# Altium footprint library Miscellaneous SMD.PcbLib: 82 footprints (part 3 of 7) (continued)
## HIROSE_FX8-120S-SV [mm] "120 Contacts, Pitch 0.6mm, Surface Mount Board to Board Receptacle, FX8 Series"
height 2.5
pads (122):
  rect 0.35x1.8 smd: 1(-17.7,2.9) 2(-17.7,-2.9) 3(-17.1,2.9) 4(-17.1,-2.9) 5(-16.5,2.9) 6(-16.5,-2.9) 7(-15.9,2.9) 8(-15.9,-2.9) 9(-15.3,2.9) 10(-15.3,-2.9) 11(-14.7,2.9) 12(-14.7,-2.9) 13(-14.1,2.9) 14(-14.1,-2.9) 15(-13.5,2.9) 16(-13.5,-2.9) 17(-12.9,2.9) 18(-12.9,-2.9) 19(-12.3,2.9) 20(-12.3,-2.9) 21(-11.7,2.9) 22(-11.7,-2.9) 23(-11.1,2.9) 24(-11.1,-2.9) 25(-10.5,2.9) 26(-10.5,-2.9) 27(-9.9,2.9) 28(-9.9,-2.9) 29(-9.3,2.9) 30(-9.3,-2.9) 31(-8.7,2.9) 32(-8.7,-2.9) 33(-8.1,2.9) 34(-8.1,-2.9) 35(-7.5,2.9) 36(-7.5,-2.9) 37(-6.9,2.9) 38(-6.9,-2.9) 39(-6.3,2.9) 40(-6.3,-2.9) 41(-5.7,2.9) 42(-5.7,-2.9) 43(-5.1,2.9) 44(-5.1,-2.9) 45(-4.5,2.9) 46(-4.5,-2.9) 47(-3.9,2.9) 48(-3.9,-2.9) 49(-3.3,2.9) 50(-3.3,-2.9) 51(-2.7,2.9) 52(-2.7,-2.9) 53(-2.1,2.9) 54(-2.1,-2.9) 55(-1.5,2.9) 56(-1.5,-2.9) 57(-0.9,2.9) 58(-0.9,-2.9) 59(-0.3,2.9) 60(-0.3,-2.9) 61(0.3,2.9) 62(0.3,-2.9) 63(0.9,2.9) 64(0.9,-2.9) 65(1.5,2.9) 66(1.5,-2.9) 67(2.1,2.9) 68(2.1,-2.9) 69(2.7,2.9) 70(2.7,-2.9) 71(3.3,2.9) 72(3.3,-2.9) 73(3.9,2.9) 74(3.9,-2.9) 75(4.5,2.9) 76(4.5,-2.9) 77(5.1,2.9) 78(5.1,-2.9) 79(5.7,2.9) 80(5.7,-2.9) 81(6.3,2.9) 82(6.3,-2.9) 83(6.9,2.9) 84(6.9,-2.9) 85(7.5,2.9) 86(7.5,-2.9) 87(8.1,2.9) 88(8.1,-2.9) 89(8.7,2.9) 90(8.7,-2.9) 91(9.3,2.9) 92(9.3,-2.9) 93(9.9,2.9) 94(9.9,-2.9) 95(10.5,2.9) 96(10.5,-2.9) 97(11.1,2.9) 98(11.1,-2.9) 99(11.7,2.9) 100(11.7,-2.9) 101(12.3,2.9) 102(12.3,-2.9) 103(12.9,2.9) 104(12.9,-2.9) 105(13.5,2.9) 106(13.5,-2.9) 107(14.1,2.9) 108(14.1,-2.9) 109(14.7,2.9) 110(14.7,-2.9) 111(15.3,2.9) 112(15.3,-2.9) 113(15.9,2.9) 114(15.9,-2.9) 115(16.5,2.9) 116(16.5,-2.9) 117(17.1,2.9) 118(17.1,-2.9) 119(17.7,2.9) 120(17.7,-2.9)
  round 0.5 hole 1.1 unplated mask+0.3: P1(-20.1,1.8)
  round 0.5 hole 0.7 unplated mask+0.1: P1(20.1,1.8)
Top Overlay:
  circle w0.25: c-18.475,3.55 r0.125
  lines w0.2: -20.836,1.375 -21.125,1.375 ; -20.735,2.365 -21.3,1.8 -21.3,-2.8 -18.175,-2.8 ; -20.665,2.435 -20.3,2.8 -18.175,2.8 ; -19.474,2.375 -18.175,2.375 ; -19.4,-2.125 -19.6,-2.325 ; -19.4,-1.725 -19.4,-2.175 ; -19.4,0.775 -19.4,1.318 ; -19.337,2.175 -18.175,2.175 ; -18.9,-1.725 -18.9,0.775 ; -18.65,-1.475 18.65,-1.475 ; -18.65,0.776 -20.525,0.775 ; -18.175,-2.375 -19.6,-2.375 ; -18.175,-2.175 -19.4,-2.175 ; 18.175,-2.8 21.3,-2.8 21.3,2.8 18.175,2.8 ; 18.175,-2.375 19.6,-2.375 ; 18.175,-2.175 19.4,-2.175 ; 18.175,2.175 19.4,2.175 ; 18.175,2.375 19.6,2.375 ; 18.65,0.775 20.525,0.775 ; 18.9,-1.725 18.9,0.775 ; 19.4,-2.125 19.6,-2.325 ; 19.4,-1.725 19.4,-2.175 ; 19.4,0.775 19.4,2.175 ; 19.4,1.175 19.6,1.375 ; 19.6,2.215 19.6,2.375 ; 20.592,1.375 21.125,1.375 ; -21.125,-2.325 -20.525,-1.725 ; -21.125,-2.325 -19.6,-2.325 ; -21.125,-2.325 -21.125,1.375 ; -21.125,1.375 -20.525,0.775 ; -20.525,-1.725 -18.65,-1.725 -18.65,1.475 18.65,1.475 18.65,-1.725 20.525,-1.725 ; -20.525,-1.725 -20.525,0.775 ; -19.6,-2.375 -19.4,-2.175 ; -19.6,-2.375 -19.6,-2.325 ; 19.4,-2.175 19.6,-2.375 ; 19.4,2.175 19.6,2.375 ; 19.6,-2.375 19.6,-2.325 ; 19.6,-2.325 21.125,-2.325 ; 20.525,-1.725 20.525,0.775 ; 20.525,-1.725 21.125,-2.325 ; 20.525,0.775 21.125,1.375 ; 21.125,-2.325 21.125,1.375
Mechanical 8:
  drawing of 734 lines, arcs and shapes, not listed
Mechanical 14:
  drawing of 408 lines, arcs and shapes, not listed
Mechanical 15:
  lines w0.05: -21.55,-4.05 -21.55,4.05 21.55,4.05 21.55,-4.05 -21.55,-4.05
3D body "HIROSE_FX8-120S-SV.stp": height 2.25, standoff -0.75, extent -21.3,-3.5 21.3,3.5

## HIROSE_FX8C-60P-SV2 [mm] "60 Contacts, Pitch 0.6mm, Surface Mount Board to Board Header, FX8C Series"
height 7.1
pads (62):
  rect 0.35x2.45 smd: 1(-8.7,-2.225) 2(-8.7,2.225) 3(-8.1,-2.225) 4(-8.1,2.225) 5(-7.5,-2.225) 6(-7.5,2.225) 7(-6.9,-2.225) 8(-6.9,2.225) 9(-6.3,-2.225) 10(-6.3,2.225) 11(-5.7,-2.225) 12(-5.7,2.225) 13(-5.1,-2.225) 14(-5.1,2.225) 15(-4.5,-2.225) 16(-4.5,2.225) 17(-3.9,-2.225) 18(-3.9,2.225) 19(-3.3,-2.225) 20(-3.3,2.225) 21(-2.7,-2.225) 22(-2.7,2.225) 23(-2.1,-2.225) 24(-2.1,2.225) 25(-1.5,-2.225) 26(-1.5,2.225) 27(-0.9,-2.225) 28(-0.9,2.225) 29(-0.3,-2.225) 30(-0.3,2.225) 31(0.3,-2.225) 32(0.3,2.225) 33(0.9,-2.225) 34(0.9,2.225) 35(1.5,-2.225) 36(1.5,2.225) 37(2.1,-2.225) 38(2.1,2.225) 39(2.7,-2.225) 40(2.7,2.225) 41(3.3,-2.225) 42(3.3,2.225) 43(3.9,-2.225) 44(3.9,2.225) 45(4.5,-2.225) 46(4.5,2.225) 47(5.1,-2.225) 48(5.1,2.225) 49(5.7,-2.225) 50(5.7,2.225) 51(6.3,-2.225) 52(6.3,2.225) 53(6.9,-2.225) 54(6.9,2.225) 55(7.5,-2.225) 56(7.5,2.225) 57(8.1,-2.225) 58(8.1,2.225) 59(8.7,-2.225) 60(8.7,2.225)
  round 0.5 hole 1.1 unplated mask+0.3: P1(-11.1,-1.5)
  round 0.5 hole 0.7 unplated mask+0.1: P1(11.1,-1.5)
Top Overlay:
  circle w0.25: c-9.475,-3.2 r0.125
  lines w0.2: -11.625,-1 -11.75,-1 -11.75,1.95 -10.35,1.95 ; -10.575,-1 -10.35,-1 ; -10.35,-0.75 -10.35,-2.15 -9.225,-2.15 ; -10.35,1.7 -10.35,2.15 -9.225,2.15 ; -10.35,-0.75 -10.35,1.7 ; -9.699,0.75 -9.225,0.75 ; -9.699,1.551 -9.2,1.551 ; -9.225,-2.55 -11.3,-2.55 -12.3,-1.55 -12.3,2.55 -9.225,2.55 ; -9.225,-1.55 -9.699,-1.55 -9.699,1.7 -11.326,1.7 ccw(c-11.318,1.518) -11.5,1.526 -11.5,-0.576 ccw(c-11.321,-0.571) -11.314,-0.75 -9.225,-0.75 ; 9.225,-2.55 12.3,-2.55 12.3,2.55 9.225,2.55 ; 9.225,-2.15 10.35,-2.15 10.35,-0.75 10.35,1.7 ; 9.225,-1.549 9.7,-1.549 ; 9.225,-0.75 9.7,-0.75 11.314,-0.751 ccw(c11.317,-0.568) 11.5,-0.576 11.5,1.526 ccw(c11.32,1.52) 11.326,1.7 9.699,1.7 9.7,-1.55 ; 9.225,0.75 9.699,0.75 ; 9.225,1.55 9.699,1.55 ; 9.225,2.15 10.35,2.15 10.35,1.7 ; 10.35,-1 10.94,-1 ; 10.35,1.95 11.75,1.95 11.75,-1 11.26,-1
Mechanical 8:
  lines w0.05: -11.6,-1.5 -11.1,-1.5 ; -11.1,-2 -11.1,-1.5 ; -11.1,-1 -11.1,-1.5 ; -10.6,-1.5 -11.1,-1.5 ; -9.2,-2.225 -8.7,-2.225 ; -9.2,2.225 -8.7,2.225 ; -8.7,-2.725 -8.7,-2.225 ; -8.7,-1.725 -8.7,-2.225 ; -8.7,1.725 -8.7,2.225 ; -8.7,2.725 -8.7,2.225 ; -8.1,-2.725 -8.1,-2.225 ; -8.1,-1.725 -8.1,-2.225 ; -8.1,1.725 -8.1,2.225 ; -8.1,2.725 -8.1,2.225 ; -7.5,-2.225 -8.1,-2.225 ; -7.5,2.225 -8.1,2.225 ; -0.5,0 0,0 ; 0,-0.5 0,0 ; 0,0.5 0,0 ; 0.5,0 0,0 ; 7.5,-2.225 8.1,-2.225 ; 7.5,2.225 8.1,2.225 ; 8.1,-2.725 8.1,-2.225 ; 8.1,-1.725 8.1,-2.225 ; 8.1,1.725 8.1,2.225 ; 8.1,2.725 8.1,2.225 ; 8.7,-2.725 8.7,-2.225 ; 8.7,-1.725 8.7,-2.225 ; 8.7,1.725 8.7,2.225 ; 8.7,2.725 8.7,2.225 ; 9.2,-2.225 8.7,-2.225 ; 9.2,2.225 8.7,2.225 ; 10.6,-1.5 11.1,-1.5 ; 11.1,-2 11.1,-1.5 ; 11.1,-1 11.1,-1.5 ; 11.6,-1.5 11.1,-1.5 ; -8.7,-2.225 -8.1,-2.225 ; -8.7,2.225 -8.1,2.225 ; 8.1,-2.225 8.7,-2.225 ; 8.1,2.225 8.7,2.225 ; -8.875,-3.45 -8.875,-1 -8.525,-1 -8.525,-3.45 -8.875,-3.45 ; -8.875,1 -8.875,3.45 -8.525,3.45 -8.525,1 -8.875,1 ; -8.275,-3.45 -8.275,-1 -7.925,-1 -7.925,-3.45 -8.275,-3.45 ; -8.275,1 -8.275,3.45 -7.925,3.45 -7.925,1 -8.275,1 ; 7.925,-3.45 7.925,-1 8.275,-1 8.275,-3.45 7.925,-3.45 ; 7.925,1 7.925,3.45 8.275,3.45 8.275,1 7.925,1 ; 8.525,-3.45 8.525,-1 8.875,-1 8.875,-3.45 8.525,-3.45 ; 8.525,1 8.525,3.45 8.875,3.45 8.875,1 8.525,1
Mechanical 14:
  circle w0.25: c-9.475,-3.2 r0.125
  lines w0.1: -10.35,-1 -11.75,-1 -11.75,1.95 -10.35,1.95 ; -10.35,-0.75 -10.35,-2.15 10.35,-2.15 10.35,-0.75 10.35,1.7 ; -10.35,1.7 -10.35,2.15 10.35,2.15 10.35,1.7 ; -10.35,-0.75 -10.35,1.7 ; -9.699,0.75 -9,0.75 -9,-0.75 -11.314,-0.75 cw(c-11.321,-0.571) -11.5,-0.576 -11.5,1.526 cw(c-11.318,1.518) -11.326,1.7 -9.699,1.7 -9.699,-1.55 9.7,-1.55 9.699,1.7 11.326,1.7 cw(c11.32,1.52) 11.5,1.526 11.5,-0.576 cw(c11.317,-0.568) 11.314,-0.751 9.7,-0.75 9,-0.75 9,0.75 9.699,0.75 ; -9.699,1.55 9.699,1.55 ; -8.825,-2.55 -8.825,-3.25 -8.575,-3.25 -8.575,-2.55 ; -8.825,2.55 -8.825,3.25 -8.575,3.25 -8.575,2.55 ; -8.225,-2.55 -8.225,-3.25 -7.975,-3.25 -7.975,-2.55 ; -8.225,2.55 -8.225,3.25 -7.975,3.25 -7.975,2.55 ; 7.975,-2.55 7.975,-3.25 8.225,-3.25 8.225,-2.55 ; 7.975,2.55 7.975,3.25 8.225,3.25 8.225,2.55 ; 8.575,-2.55 8.575,-3.25 8.825,-3.25 8.825,-2.55 ; 8.575,2.55 8.575,3.25 8.825,3.25 8.825,2.55 ; 10.35,-1 11.75,-1 11.75,1.95 10.35,1.95 ; -12.3,-1.55 -12.3,2.55 12.3,2.55 12.3,-2.55 -11.3,-2.55 -12.3,-1.55
Mechanical 15:
  lines w0.05: -12.55,-3.7 -12.55,3.7 12.55,3.7 12.55,-3.7 -12.55,-3.7
3D body "HIROSE_FX8C-60P-SV2.stp": height 6.8, standoff -0.85, extent -12.3,-3.25 12.3,3.25

## HIROSE_FX8C-60S-SV [mm] "60 Contacts, Pitch 0.6mm, Surface Mount Board to Board Receptacle, FX8C Series"
height 4.2
pads (62):
  rect 0.35x1.7 smd: 1(-8.7,2.85) 2(-8.7,-2.85) 3(-8.1,2.85) 4(-8.1,-2.85) 5(-7.5,2.85) 6(-7.5,-2.85) 7(-6.9,2.85) 8(-6.9,-2.85) 9(-6.3,2.85) 10(-6.3,-2.85) 11(-5.7,2.85) 12(-5.7,-2.85) 13(-5.1,2.85) 14(-5.1,-2.85) 15(-4.5,2.85) 16(-4.5,-2.85) 17(-3.9,2.85) 18(-3.9,-2.85) 19(-3.3,2.85) 20(-3.3,-2.85) 21(-2.7,2.85) 22(-2.7,-2.85) 23(-2.1,2.85) 24(-2.1,-2.85) 25(-1.5,2.85) 26(-1.5,-2.85) 27(-0.9,2.85) 28(-0.9,-2.85) 29(-0.3,2.85) 30(-0.3,-2.85) 31(0.3,2.85) 32(0.3,-2.85) 33(0.9,2.85) 34(0.9,-2.85) 35(1.5,2.85) 36(1.5,-2.85) 37(2.1,2.85) 38(2.1,-2.85) 39(2.7,2.85) 40(2.7,-2.85) 41(3.3,2.85) 42(3.3,-2.85) 43(3.9,2.85) 44(3.9,-2.85) 45(4.5,2.85) 46(4.5,-2.85) 47(5.1,2.85) 48(5.1,-2.85) 49(5.7,2.85) 50(5.7,-2.85) 51(6.3,2.85) 52(6.3,-2.85) 53(6.9,2.85) 54(6.9,-2.85) 55(7.5,2.85) 56(7.5,-2.85) 57(8.1,2.85) 58(8.1,-2.85) 59(8.7,2.85) 60(8.7,-2.85)
  round 0.5 hole 1.1 unplated mask+0.3: P1(-11.1,1.8)
  round 0.5 hole 0.7 unplated mask+0.1: P1(11.1,1.8)
Top Overlay:
  circle w0.25: c-9.475,3.55 r0.125
  lines w0.2: -11.836,1.375 -12.125,1.375 ; -11.735,2.365 -12.3,1.8 -12.3,-2.8 -9.175,-2.8 ; -11.665,2.435 -11.3,2.8 -9.175,2.8 ; -10.474,2.375 -9.175,2.375 ; -10.4,-2.125 -10.6,-2.325 ; -10.4,-1.725 -10.4,-2.175 ; -10.4,0.775 -10.4,1.318 ; -10.337,2.175 -9.175,2.175 ; -9.9,-1.725 -9.9,0.775 ; -9.65,-1.475 9.65,-1.475 ; -9.65,0.776 -11.525,0.775 ; -9.175,-2.375 -10.6,-2.375 ; -9.175,-2.175 -10.4,-2.175 ; 9.175,-2.8 12.3,-2.8 12.3,2.8 9.175,2.8 ; 9.175,-2.375 10.6,-2.375 ; 9.175,-2.175 10.4,-2.175 ; 9.175,2.175 10.4,2.175 ; 9.175,2.375 10.6,2.375 ; 9.65,0.775 11.525,0.775 ; 9.9,-1.725 9.9,0.775 ; 10.4,-2.125 10.6,-2.325 ; 10.4,-1.725 10.4,-2.175 ; 10.4,0.775 10.4,2.175 ; 10.4,1.175 10.6,1.375 ; 10.6,2.215 10.6,2.375 ; 11.592,1.375 12.125,1.375 ; -12.125,-2.325 -11.525,-1.725 ; -12.125,-2.325 -10.6,-2.325 ; -12.125,-2.325 -12.125,1.375 ; -12.125,1.375 -11.525,0.775 ; -11.525,-1.725 -9.65,-1.725 -9.65,1.475 9.65,1.475 9.65,-1.725 11.525,-1.725 ; -11.525,-1.725 -11.525,0.775 ; -10.6,-2.375 -10.4,-2.175 ; -10.6,-2.375 -10.6,-2.325 ; 10.4,-2.175 10.6,-2.375 ; 10.4,2.175 10.6,2.375 ; 10.6,-2.375 10.6,-2.325 ; 10.6,-2.325 12.125,-2.325 ; 11.525,-1.725 11.525,0.775 ; 11.525,-1.725 12.125,-2.325 ; 11.525,0.775 12.125,1.375 ; 12.125,-2.325 12.125,1.375
Mechanical 8:
  circle w0.05: c-11.1,1.8 r0.55
  lines w0.05: -11.6,1.8 -11.1,1.8 ; -11.1,1.3 -11.1,1.8 ; -11.1,2.3 -11.1,1.8 ; -10.6,1.8 -11.1,1.8 ; -9.2,-2.85 -8.7,-2.85 ; -9.2,2.85 -8.7,2.85 ; -8.7,-3.35 -8.7,-2.85 ; -8.7,-2.35 -8.7,-2.85 ; -8.7,2.35 -8.7,2.85 ; -8.7,3.35 -8.7,2.85 ; -8.1,-3.35 -8.1,-2.85 ; -8.1,-2.35 -8.1,-2.85 ; -8.1,2.35 -8.1,2.85 ; -8.1,3.35 -8.1,2.85 ; -7.5,-2.85 -8.1,-2.85 ; -7.5,2.85 -8.1,2.85 ; -0.5,0 0,0 ; 0,-0.5 0,0 ; 0,0.5 0,0 ; 0.5,0 0,0 ; 7.5,-2.85 8.1,-2.85 ; 7.5,2.85 8.1,2.85 ; 8.1,-3.35 8.1,-2.85 ; 8.1,-2.35 8.1,-2.85 ; 8.1,2.35 8.1,2.85 ; 8.1,3.35 8.1,2.85 ; 8.7,-3.35 8.7,-2.85 ; 8.7,-2.35 8.7,-2.85 ; 8.7,2.35 8.7,2.85 ; 8.7,3.35 8.7,2.85 ; 9.2,-2.85 8.7,-2.85 ; 9.2,2.85 8.7,2.85 ; 10.6,1.8 11.1,1.8 ; 11.1,1.3 11.1,1.8 ; 11.1,2.3 11.1,1.8 ; 11.6,1.8 11.1,1.8 ; -8.7,-2.85 -8.1,-2.85 ; -8.7,2.85 -8.1,2.85 ; 8.1,-2.85 8.7,-2.85 ; 8.1,2.85 8.7,2.85 ; -8.875,-3.7 -8.875,-2 -8.525,-2 -8.525,-3.7 -8.875,-3.7 ; -8.875,2 -8.875,3.7 -8.525,3.7 -8.525,2 -8.875,2 ; -8.275,-3.7 -8.275,-2 -7.925,-2 -7.925,-3.7 -8.275,-3.7 ; -8.275,2 -8.275,3.7 -7.925,3.7 -7.925,2 -8.275,2 ; 7.925,-3.7 7.925,-2 8.275,-2 8.275,-3.7 7.925,-3.7 ; 7.925,2 7.925,3.7 8.275,3.7 8.275,2 7.925,2 ; 8.525,-3.7 8.525,-2 8.875,-2 8.875,-3.7 8.525,-3.7 ; 8.525,2 8.525,3.7 8.875,3.7 8.875,2 8.525,2
Mechanical 14:
  circle w0.25: c-9.475,3.55 r0.125
  lines w0.1: -10.4,-2.125 -10.6,-2.325 ; -10.4,-1.725 -10.4,-2.175 ; -10.4,0.775 -10.4,2.175 ; -10.4,1.175 -10.6,1.375 ; -9.9,-1.725 -9.9,0.775 ; -9.65,0.775 -11.525,0.775 ; -8.825,-2.8 -8.825,-3.5 -8.575,-3.5 -8.575,-2.8 ; -8.825,2.8 -8.825,3.5 -8.575,3.5 -8.575,2.8 ; -8.225,-2.8 -8.225,-3.5 -7.975,-3.5 -7.975,-2.8 ; -8.225,2.8 -8.225,3.5 -7.975,3.5 -7.975,2.8 ; 7.975,-2.8 7.975,-3.5 8.225,-3.5 8.225,-2.8 ; 7.975,2.8 7.975,3.5 8.225,3.5 8.225,2.8 ; 8.575,-2.8 8.575,-3.5 8.825,-3.5 8.825,-2.8 ; 8.575,2.8 8.575,3.5 8.825,3.5 8.825,2.8 ; 9.65,0.775 11.525,0.775 ; 9.9,-1.725 9.9,0.775 ; 10.4,-2.125 10.6,-2.325 ; 10.4,-1.725 10.4,-2.175 ; 10.4,0.775 10.4,2.175 ; 10.4,1.175 10.6,1.375 ; -12.125,-2.325 -11.525,-1.725 ; -12.125,-2.325 -12.125,1.375 ; -12.125,-2.325 -10.6,-2.325 ; -12.125,1.375 -11.525,0.775 ; -12.125,1.375 -10.6,1.375 ; -11.525,-1.725 -11.525,0.775 ; -11.525,-1.725 -9.65,-1.725 -9.65,1.475 ; -10.6,-2.375 -10.4,-2.175 ; -10.6,-2.375 10.6,-2.375 ; -10.6,-2.375 -10.6,-2.325 ; -10.6,1.375 -10.6,2.375 ; -10.6,2.375 10.6,2.375 ; -10.6,2.375 -10.4,2.175 ; -10.4,-2.175 10.4,-2.175 ; -10.4,2.175 10.4,2.175 ; -9.65,1.475 9.65,1.475 ; -9.65,1.475 -9.55,1.375 ; -9.55,-1.375 -9.55,1.375 ; -9.55,-1.375 9.55,-1.375 ; -9.55,-1.375 -9.65,-1.475 9.65,-1.475 9.55,-1.375 ; -9.55,1.375 9.55,1.375 ; 9.55,-1.375 9.55,1.375 ; 9.55,1.375 9.65,1.475 ; 9.65,1.475 9.65,-1.725 11.525,-1.725 ; 10.4,-2.175 10.6,-2.375 ; 10.4,2.175 10.6,2.375 ; 10.6,-2.375 10.6,-2.325 ; 10.6,-2.325 12.125,-2.325 ; 10.6,1.375 10.6,2.375 ; 10.6,1.375 12.125,1.375 ; 11.525,-1.725 12.125,-2.325 ; 11.525,-1.725 11.525,0.775 ; 11.525,0.775 12.125,1.375 ; 12.125,-2.325 12.125,1.375 ; -12.3,-2.8 12.3,-2.8 12.3,2.8 -11.3,2.8 -12.3,1.8 -12.3,-2.8
Mechanical 15:
  lines w0.05: -12.55,-3.95 -12.55,3.95 12.55,3.95 12.55,-3.95 -12.55,-3.95
3D body "HIROSE_FX8C-60S-SV.stp": height 3.95, standoff -0.8, extent -12.3,-3.5 12.3,3.5

## HIROSE_FX8C-120P-SV [mm] "120 Contacts, Pitch 0.6mm, Surface Mount Board to Board Header, FX8C Series"
height 4.7
pads (122):
  rect 0.35x2.45 smd: 1(-17.7,-2.225) 2(-17.7,2.225) 3(-17.1,-2.225) 4(-17.1,2.225) 5(-16.5,-2.225) 6(-16.5,2.225) 7(-15.9,-2.225) 8(-15.9,2.225) 9(-15.3,-2.225) 10(-15.3,2.225) 11(-14.7,-2.225) 12(-14.7,2.225) 13(-14.1,-2.225) 14(-14.1,2.225) 15(-13.5,-2.225) 16(-13.5,2.225) 17(-12.9,-2.225) 18(-12.9,2.225) 19(-12.3,-2.225) 20(-12.3,2.225) 21(-11.7,-2.225) 22(-11.7,2.225) 23(-11.1,-2.225) 24(-11.1,2.225) 25(-10.5,-2.225) 26(-10.5,2.225) 27(-9.9,-2.225) 28(-9.9,2.225) 29(-9.3,-2.225) 30(-9.3,2.225) 31(-8.7,-2.225) 32(-8.7,2.225) 33(-8.1,-2.225) 34(-8.1,2.225) 35(-7.5,-2.225) 36(-7.5,2.225) 37(-6.9,-2.225) 38(-6.9,2.225) 39(-6.3,-2.225) 40(-6.3,2.225) 41(-5.7,-2.225) 42(-5.7,2.225) 43(-5.1,-2.225) 44(-5.1,2.225) 45(-4.5,-2.225) 46(-4.5,2.225) 47(-3.9,-2.225) 48(-3.9,2.225) 49(-3.3,-2.225) 50(-3.3,2.225) 51(-2.7,-2.225) 52(-2.7,2.225) 53(-2.1,-2.225) 54(-2.1,2.225) 55(-1.5,-2.225) 56(-1.5,2.225) 57(-0.9,-2.225) 58(-0.9,2.225) 59(-0.3,-2.225) 60(-0.3,2.225) 61(0.3,-2.225) 62(0.3,2.225) 63(0.9,-2.225) 64(0.9,2.225) 65(1.5,-2.225) 66(1.5,2.225) 67(2.1,-2.225) 68(2.1,2.225) 69(2.7,-2.225) 70(2.7,2.225) 71(3.3,-2.225) 72(3.3,2.225) 73(3.9,-2.225) 74(3.9,2.225) 75(4.5,-2.225) 76(4.5,2.225) 77(5.1,-2.225) 78(5.1,2.225) 79(5.7,-2.225) 80(5.7,2.225) 81(6.3,-2.225) 82(6.3,2.225) 83(6.9,-2.225) 84(6.9,2.225) 85(7.5,-2.225) 86(7.5,2.225) 87(8.1,-2.225) 88(8.1,2.225) 89(8.7,-2.225) 90(8.7,2.225) 91(9.3,-2.225) 92(9.3,2.225) 93(9.9,-2.225) 94(9.9,2.225) 95(10.5,-2.225) 96(10.5,2.225) 97(11.1,-2.225) 98(11.1,2.225) 99(11.7,-2.225) 100(11.7,2.225) 101(12.3,-2.225) 102(12.3,2.225) 103(12.9,-2.225) 104(12.9,2.225) 105(13.5,-2.225) 106(13.5,2.225) 107(14.1,-2.225) 108(14.1,2.225) 109(14.7,-2.225) 110(14.7,2.225) 111(15.3,-2.225) 112(15.3,2.225) 113(15.9,-2.225) 114(15.9,2.225) 115(16.5,-2.225) 116(16.5,2.225) 117(17.1,-2.225) 118(17.1,2.225) 119(17.7,-2.225) 120(17.7,2.225)
  round 0.5 hole 1.1 unplated mask+0.3: P1(-20.1,-1.5)
  round 0.5 hole 0.7 unplated mask+0.1: P1(20.1,-1.5)
Top Overlay:
  circle w0.25: c-18.475,-3.2 r0.125
  lines w0.2: -20.329,-1 -20.75,-1 -20.75,1.95 -19.35,1.95 ; -19.871,-1 -19.35,-1 ; -19.35,-0.75 -19.35,-2.15 -18.225,-2.15 ; -19.35,1.7 -19.35,2.15 -18.225,2.15 ; -19.339,-0.75 -19.339,1.7 ; -18.699,1.55 -18.225,1.55 ; -18.699,1.7 -18.699,-0.75 ; -18.225,-2.55 -20.3,-2.55 -21.3,-1.55 -21.3,2.55 -18.225,2.55 ; -18.225,-1.7 -18.7,-1.7 ; -18.225,-1.55 -18.7,-1.55 -18.7,-1.7 ; -18.225,1.7 -20.326,1.7 ccw(c-20.336,1.536) -20.5,1.526 -20.5,-0.576 ccw(c-20.333,-0.583) -20.326,-0.75 -18.699,-0.75 ; 18.225,-2.55 21.3,-2.55 21.3,2.55 18.225,2.55 ; 18.225,-2.15 19.35,-2.15 19.35,2.15 18.225,2.15 ; 18.225,-1.7 18.7,-1.7 18.7,-0.75 ; 18.225,-1.55 18.7,-1.55 ; 18.225,1.55 18.699,1.55 ; 18.225,1.7 20.326,1.7 cw(c20.333,1.532) 20.5,1.526 20.5,-0.576 cw(c20.334,-0.584) 20.326,-0.75 18.699,-0.75 ; 18.699,1.7 18.7,-0.75 ; 19.35,-1 20.75,-1 20.75,1.95 19.35,1.95 ; -18.7,-1.7 -18.7,-0.75 ; 18.7,-1.55 18.7,-1.55
Mechanical 8:
  drawing of 856 lines, arcs and shapes, not listed
Mechanical 14:
  circle w0.25: c-18.475,-3.2 r0.125
  lines w0.1: -19.35,-1 -20.75,-1 -20.75,1.95 -19.35,1.95 ; -19.35,-0.75 -19.35,-2.15 19.35,-2.15 19.35,2.15 -19.35,2.15 -19.35,1.7 ; -19.339,-0.75 -19.339,1.7 ; -18.699,1.55 18.699,1.55 ; -18.699,1.7 -18.699,-0.75 ; -17.825,-2.55 -17.825,-3.25 -17.575,-3.25 -17.575,-2.55 ; -17.825,-1.55 -17.825,-1.45 -17.575,-1.45 -17.575,-1.55 ; -17.825,1.55 -17.825,1.45 -17.575,1.45 -17.575,1.55 ; -17.825,2.55 -17.825,3.25 -17.575,3.25 -17.575,2.55 ; -17.225,-2.55 -17.225,-3.25 -16.975,-3.25 -16.975,-2.55 ; -17.225,-1.55 -17.225,-1.45 -16.975,-1.45 -16.975,-1.55 ; -17.225,1.55 -17.225,1.45 -16.975,1.45 -16.975,1.55 ; -17.225,2.55 -17.225,3.25 -16.975,3.25 -16.975,2.55 ; 16.975,-2.55 16.975,-3.25 17.225,-3.25 17.225,-2.55 ; 16.975,-1.55 16.975,-1.45 17.225,-1.45 17.225,-1.55 ; 16.975,1.55 16.975,1.45 17.225,1.45 17.225,1.55 ; 16.975,2.55 16.975,3.25 17.225,3.25 17.225,2.55 ; 17.575,-2.55 17.575,-3.25 17.825,-3.25 17.825,-2.55 ; 17.575,-1.55 17.575,-1.45 17.825,-1.45 17.825,-1.55 ; 17.575,1.55 17.575,1.45 17.825,1.45 17.825,1.55 ; 17.575,2.55 17.575,3.25 17.825,3.25 17.825,2.55 ; 18.699,1.7 18.7,-0.75 ; 19.35,-1 20.75,-1 20.75,1.95 19.35,1.95 ; -18.7,-1.7 -18.7,-1.55 18.7,-1.55 ; -18.7,-1.7 18.7,-1.7 18.7,-0.75 ; -18.7,-1.7 -18.7,-0.75 ; -18.699,-0.75 -20.326,-0.75 cw(c-20.333,-0.583) -20.5,-0.576 -20.5,1.526 cw(c-20.336,1.536) -20.326,1.7 20.326,1.7 cw(c20.333,1.532) 20.5,1.526 20.5,-0.576 cw(c20.334,-0.584) 20.326,-0.75 18.699,-0.75 ; 18.7,-1.55 18.7,-1.55 ; -21.3,-1.55 -21.3,2.55 21.3,2.55 21.3,-2.55 -20.3,-2.55 -21.3,-1.55
Mechanical 15:
  lines w0.05: -21.55,-3.7 -21.55,3.7 21.55,3.7 21.55,-3.7 -21.55,-3.7
3D body "HIROSE_FX8C-120P-SV.stp": height 4.8, standoff -0.85, extent -21.3,-3.25 21.3,3.25

## HIROSE_FX8C-120S-SV5 [mm] "120 Contacts, Pitch 0.6mm, Surface Mount Board to Board Receptacle, FX8C Series"
height 9.2
pads (122):
  rect 0.35x1.7 smd: 1(-17.7,2.85) 2(-17.7,-2.85) 3(-17.1,2.85) 4(-17.1,-2.85) 5(-16.5,2.85) 6(-16.5,-2.85) 7(-15.9,2.85) 8(-15.9,-2.85) 9(-15.3,2.85) 10(-15.3,-2.85) 11(-14.7,2.85) 12(-14.7,-2.85) 13(-14.1,2.85) 14(-14.1,-2.85) 15(-13.5,2.85) 16(-13.5,-2.85) 17(-12.9,2.85) 18(-12.9,-2.85) 19(-12.3,2.85) 20(-12.3,-2.85) 21(-11.7,2.85) 22(-11.7,-2.85) 23(-11.1,2.85) 24(-11.1,-2.85) 25(-10.5,2.85) 26(-10.5,-2.85) 27(-9.9,2.85) 28(-9.9,-2.85) 29(-9.3,2.85) 30(-9.3,-2.85) 31(-8.7,2.85) 32(-8.7,-2.85) 33(-8.1,2.85) 34(-8.1,-2.85) 35(-7.5,2.85) 36(-7.5,-2.85) 37(-6.9,2.85) 38(-6.9,-2.85) 39(-6.3,2.85) 40(-6.3,-2.85) 41(-5.7,2.85) 42(-5.7,-2.85) 43(-5.1,2.85) 44(-5.1,-2.85) 45(-4.5,2.85) 46(-4.5,-2.85) 47(-3.9,2.85) 48(-3.9,-2.85) 49(-3.3,2.85) 50(-3.3,-2.85) 51(-2.7,2.85) 52(-2.7,-2.85) 53(-2.1,2.85) 54(-2.1,-2.85) 55(-1.5,2.85) 56(-1.5,-2.85) 57(-0.9,2.85) 58(-0.9,-2.85) 59(-0.3,2.85) 60(-0.3,-2.85) 61(0.3,2.85) 62(0.3,-2.85) 63(0.9,2.85) 64(0.9,-2.85) 65(1.5,2.85) 66(1.5,-2.85) 67(2.1,2.85) 68(2.1,-2.85) 69(2.7,2.85) 70(2.7,-2.85) 71(3.3,2.85) 72(3.3,-2.85) 73(3.9,2.85) 74(3.9,-2.85) 75(4.5,2.85) 76(4.5,-2.85) 77(5.1,2.85) 78(5.1,-2.85) 79(5.7,2.85) 80(5.7,-2.85) 81(6.3,2.85) 82(6.3,-2.85) 83(6.9,2.85) 84(6.9,-2.85) 85(7.5,2.85) 86(7.5,-2.85) 87(8.1,2.85) 88(8.1,-2.85) 89(8.7,2.85) 90(8.7,-2.85) 91(9.3,2.85) 92(9.3,-2.85) 93(9.9,2.85) 94(9.9,-2.85) 95(10.5,2.85) 96(10.5,-2.85) 97(11.1,2.85) 98(11.1,-2.85) 99(11.7,2.85) 100(11.7,-2.85) 101(12.3,2.85) 102(12.3,-2.85) 103(12.9,2.85) 104(12.9,-2.85) 105(13.5,2.85) 106(13.5,-2.85) 107(14.1,2.85) 108(14.1,-2.85) 109(14.7,2.85) 110(14.7,-2.85) 111(15.3,2.85) 112(15.3,-2.85) 113(15.9,2.85) 114(15.9,-2.85) 115(16.5,2.85) 116(16.5,-2.85) 117(17.1,2.85) 118(17.1,-2.85) 119(17.7,2.85) 120(17.7,-2.85)
  round 0.5 hole 1.1 unplated mask+0.3: P1(-20.1,1.8)
  round 0.5 hole 0.7 unplated mask+0.1: P1(20.1,1.8)
Top Overlay:
  circle w0.25: c-18.475,3.55 r0.125
  lines w0.2: -20.449,1.375 -21.125,1.375 ; -19.751,1.375 -19.6,1.375 ; -19.6,1.571 -19.6,1.375 ; -19.6,2.029 -19.6,2.375 ; -19.4,-2.125 -19.6,-2.325 ; -19.4,-1.725 -19.4,-2.175 ; -19.4,0.775 -19.4,2.175 ; -19.4,1.175 -19.6,1.375 ; -19.3,-0.6 -18.9,-0.6 ; -19.3,0.6 -18.9,0.6 ; -19.3,0.775 -19.3,-0.8 -18.9,-0.8 ; -18.9,-1.725 -18.9,0.775 ; -18.65,0.775 -20.525,0.775 ; -18.225,-2.8 -21.3,-2.8 -21.3,1.8 -20.3,2.8 -18.225,2.8 ; -18.225,-2.375 -19.6,-2.375 ; -18.225,-2.175 -19.4,-2.175 ; -18.225,2.175 -19.4,2.175 ; -18.225,2.375 -19.6,2.375 ; 18.225,-2.8 21.3,-2.8 21.3,2.8 18.225,2.8 ; 18.225,-2.375 19.6,-2.375 ; 18.225,-2.175 19.4,-2.175 ; 18.225,2.175 19.4,2.175 ; 18.225,2.375 19.6,2.375 ; 18.65,0.775 20.525,0.775 ; 18.9,-1.725 18.9,0.775 ; 18.9,-0.8 19.3,-0.8 19.3,0.775 ; 18.9,-0.6 19.3,-0.6 ; 18.9,0.6 19.3,0.6 ; 19.4,-2.125 19.6,-2.325 ; 19.4,-1.725 19.4,-2.175 ; 19.4,0.775 19.4,2.175 ; 19.4,1.175 19.6,1.375 ; -21.125,-2.325 -20.525,-1.725 ; -21.125,-2.325 -21.125,1.375 ; -21.125,-2.325 -19.6,-2.325 ; -21.125,1.375 -20.525,0.775 ; -20.525,-1.725 -20.525,0.775 ; -20.525,-1.725 -18.65,-1.725 -18.65,1.475 ; -19.6,-2.375 -19.6,-2.325 ; -19.6,-2.375 -19.4,-2.175 ; -19.6,2.375 -19.4,2.175 ; -18.65,1.475 -18.55,1.375 ; -18.65,1.475 18.65,1.475 ; -18.55,-1.375 -18.55,1.375 ; -18.55,-1.375 -18.65,-1.475 18.65,-1.475 18.55,-1.375 ; -18.55,-1.375 18.55,-1.375 ; -18.55,1.375 18.55,1.375 ; 18.55,-1.375 18.55,1.375 ; 18.55,1.375 18.65,1.475 ; 18.65,1.475 18.65,-1.725 20.525,-1.725 ; 19.4,-2.175 19.6,-2.375 ; 19.4,2.175 19.6,2.375 ; 19.6,-2.375 19.6,-2.325 ; 19.6,-2.325 21.125,-2.325 ; 19.6,1.375 19.6,2.375 ; 19.6,1.375 21.125,1.375 ; 20.525,-1.725 21.125,-2.325 ; 20.525,-1.725 20.525,0.775 ; 20.525,0.775 21.125,1.375 ; 21.125,-2.325 21.125,1.375
Mechanical 8:
  drawing of 856 lines, arcs and shapes, not listed
Mechanical 14:
  lines w0.1: -19.4,-2.125 -19.6,-2.325 ; -19.4,-1.725 -19.4,-2.175 ; -19.4,0.775 -19.4,2.175 ; -19.4,1.175 -19.6,1.375 ; -19.3,-0.6 -18.9,-0.6 ; -19.3,0.6 -18.9,0.6 ; -19.3,0.775 -19.3,-0.8 -18.9,-0.8 ; -18.9,-1.725 -18.9,0.775 ; -18.65,0.775 -20.525,0.775 ; -17.825,-2.8 -17.825,-3.5 -17.575,-3.5 -17.575,-2.8 ; -17.825,2.8 -17.825,3.5 -17.575,3.5 -17.575,2.8 ; -17.225,-2.8 -17.225,-3.5 -16.975,-3.5 -16.975,-2.8 ; -17.225,2.8 -17.225,3.5 -16.975,3.5 -16.975,2.8 ; 16.975,-2.8 16.975,-3.5 17.225,-3.5 17.225,-2.8 ; 16.975,2.8 16.975,3.5 17.225,3.5 17.225,2.8 ; 17.575,-2.8 17.575,-3.5 17.825,-3.5 17.825,-2.8 ; 17.575,2.8 17.575,3.5 17.825,3.5 17.825,2.8 ; 18.65,0.775 20.525,0.775 ; 18.9,-1.725 18.9,0.775 ; 18.9,-0.8 19.3,-0.8 19.3,0.775 ; 18.9,-0.6 19.3,-0.6 ; 18.9,0.6 19.3,0.6 ; 19.4,-2.125 19.6,-2.325 ; 19.4,-1.725 19.4,-2.175 ; 19.4,0.775 19.4,2.175 ; 19.4,1.175 19.6,1.375 ; -21.125,-2.325 -20.525,-1.725 ; -21.125,-2.325 -21.125,1.375 ; -21.125,-2.325 -19.6,-2.325 ; -21.125,1.375 -20.525,0.775 ; -21.125,1.375 -19.6,1.375 ; -20.525,-1.725 -20.525,0.775 ; -20.525,-1.725 -18.65,-1.725 -18.65,1.475 ; -19.6,-2.375 -19.6,-2.325 ; -19.6,-2.375 19.6,-2.375 ; -19.6,-2.375 -19.4,-2.175 ; -19.6,1.375 -19.6,2.375 ; -19.6,2.375 -19.4,2.175 ; -19.6,2.375 19.6,2.375 ; -19.4,-2.175 19.4,-2.175 ; -19.4,2.175 19.4,2.175 ; -18.65,1.475 -18.55,1.375 ; -18.65,1.475 18.65,1.475 ; -18.55,-1.375 -18.55,1.375 ; -18.55,-1.375 -18.65,-1.475 18.65,-1.475 18.55,-1.375 ; -18.55,-1.375 18.55,-1.375 ; -18.55,1.375 18.55,1.375 ; 18.55,-1.375 18.55,1.375 ; 18.55,1.375 18.65,1.475 ; 18.65,1.475 18.65,-1.725 20.525,-1.725 ; 19.4,-2.175 19.6,-2.375 ; 19.4,2.175 19.6,2.375 ; 19.6,-2.375 19.6,-2.325 ; 19.6,-2.325 21.125,-2.325 ; 19.6,1.375 19.6,2.375 ; 19.6,1.375 21.125,1.375 ; 20.525,-1.725 21.125,-2.325 ; 20.525,-1.725 20.525,0.775 ; 20.525,0.775 21.125,1.375 ; 21.125,-2.325 21.125,1.375 ; -21.3,-2.8 -21.3,1.8 -20.3,2.8 21.3,2.8 21.3,-2.8 -21.3,-2.8
Mechanical 15:
  lines w0.05: -21.55,-3.95 21.55,-3.95 21.55,3.95 -21.55,3.95 -21.55,-3.95
3D body "HIROSE_FX8C-120S-SV5.stp": height 8.95, standoff -0.75, extent -21.3,-3.5 21.3,3.5

## HIROSE_U.FL-R-SMT-1(10) [mm] "Up to 6GHz Ultra Small Surface Mount Male Coaxial Connectors U.FL Series"
height 1.25
pads (3):
  rect 1x1.05 smd: 1(0,-1.525)
  rect 1.05x2.2 smd: 2(-1.475,0) 2(1.475,0)
Top Layer keep-out:
  lines w0.1: -0.6,-0.65 0.6,-0.65 0.6,0 ccw(c0,0) -0.6,0 -0.6,-0.65
Top Overlay:
  circle w0.2: c0,0 r0.25
  lines w0.2: -0.7,1.3 -0.3,1.3 ; -0.612,-0.516 ccw(c0,0) -0.397,-0.695 ; -0.612,0.516 cw(c0,0) 0.612,0.516 ; -0.3,0.75 -0.3,1.55 0.3,1.55 0.3,0.75 ; 0.3,1.3 0.7,1.3 ; 0.397,-0.695 ccw(c0,0) 0.612,-0.516
Mechanical 8:
  lines w0.1: -1.975,0 -1.475,0 ; -1.475,-0.5 -1.475,0 ; -1.475,0.5 -1.475,0 ; -0.975,0 -1.475,0 ; -0.5,-1.525 0,-1.525 ; -0.5,0 0,0 ; 0,-2.025 0,-1.525 ; 0,-1.025 0,-1.525 ; 0,-0.5 0,0 ; 0,0.5 0,0 ; 0.5,-1.525 0,-1.525 ; 0.5,0 0,0 ; 0.975,0 1.475,0 ; 1.475,-0.5 1.475,0 ; 1.475,0.5 1.475,0 ; 1.975,0 1.475,0
Mechanical 14:
  circle w0.1: c0,0 r1
  circle w0.1: c0,0 r0.85
  circle w0.1: c0,0 r0.25
  lines w0.1: -1.3,-0.9 -1.5,-0.9 -1.5,0.9 -1.3,0.9 ; -0.3,-1.3 -0.3,-1.55 0.3,-1.55 0.3,-1.3 ; -0.3,0.954 -0.3,1.55 0.3,1.55 0.3,0.954 ; -0.3,1.3 -1,1.3 ccw(c-1,1) -1.3,1 -1.3,-1 ccw(c-1,-1) -1,-1.3 1,-1.3 ccw(c1,-1) 1.3,-1 1.3,1 ccw(c1,1) 1,1.3 0.3,1.3 ; 1.3,-0.9 1.5,-0.9 1.5,0.9 1.3,0.9
Mechanical 15:
  lines w0.1: 0.75,1.55 1.55,1.55 ; 1.55,1.55 0.55,1.55 0.55,1.8 -0.55,1.8 -0.55,1.55 -1.55,1.55 -1.55,1.35 -2.25,1.35 -2.25,-1.35 -1.55,-1.35 -1.55,-1.55 -0.75,-1.55 -0.75,-2.3 0.75,-2.3 0.75,-1.55 1.55,-1.55 1.55,-1.35 2.25,-1.35 2.25,1.35 1.55,1.35 1.55,1.55
3D body "HIROSE_U.FL-R-SMT-1(10).stp": height 1.25, standoff 0, extent -1.5,-1.55 1.5,1.55